# Altium footprint library Amirreza.PcbLib: 524 footprints (part 10 of 33)
Each footprint in its own frame and in the unit in brackets; x right, y up, seen from the top. Pads: shape width x height; smd on the part's side, far side on the other; paste and mask are expansions set on the pad; w line width, h text height; cw(c..) or ccw(c..) is an arc to the next point about the centre after c.
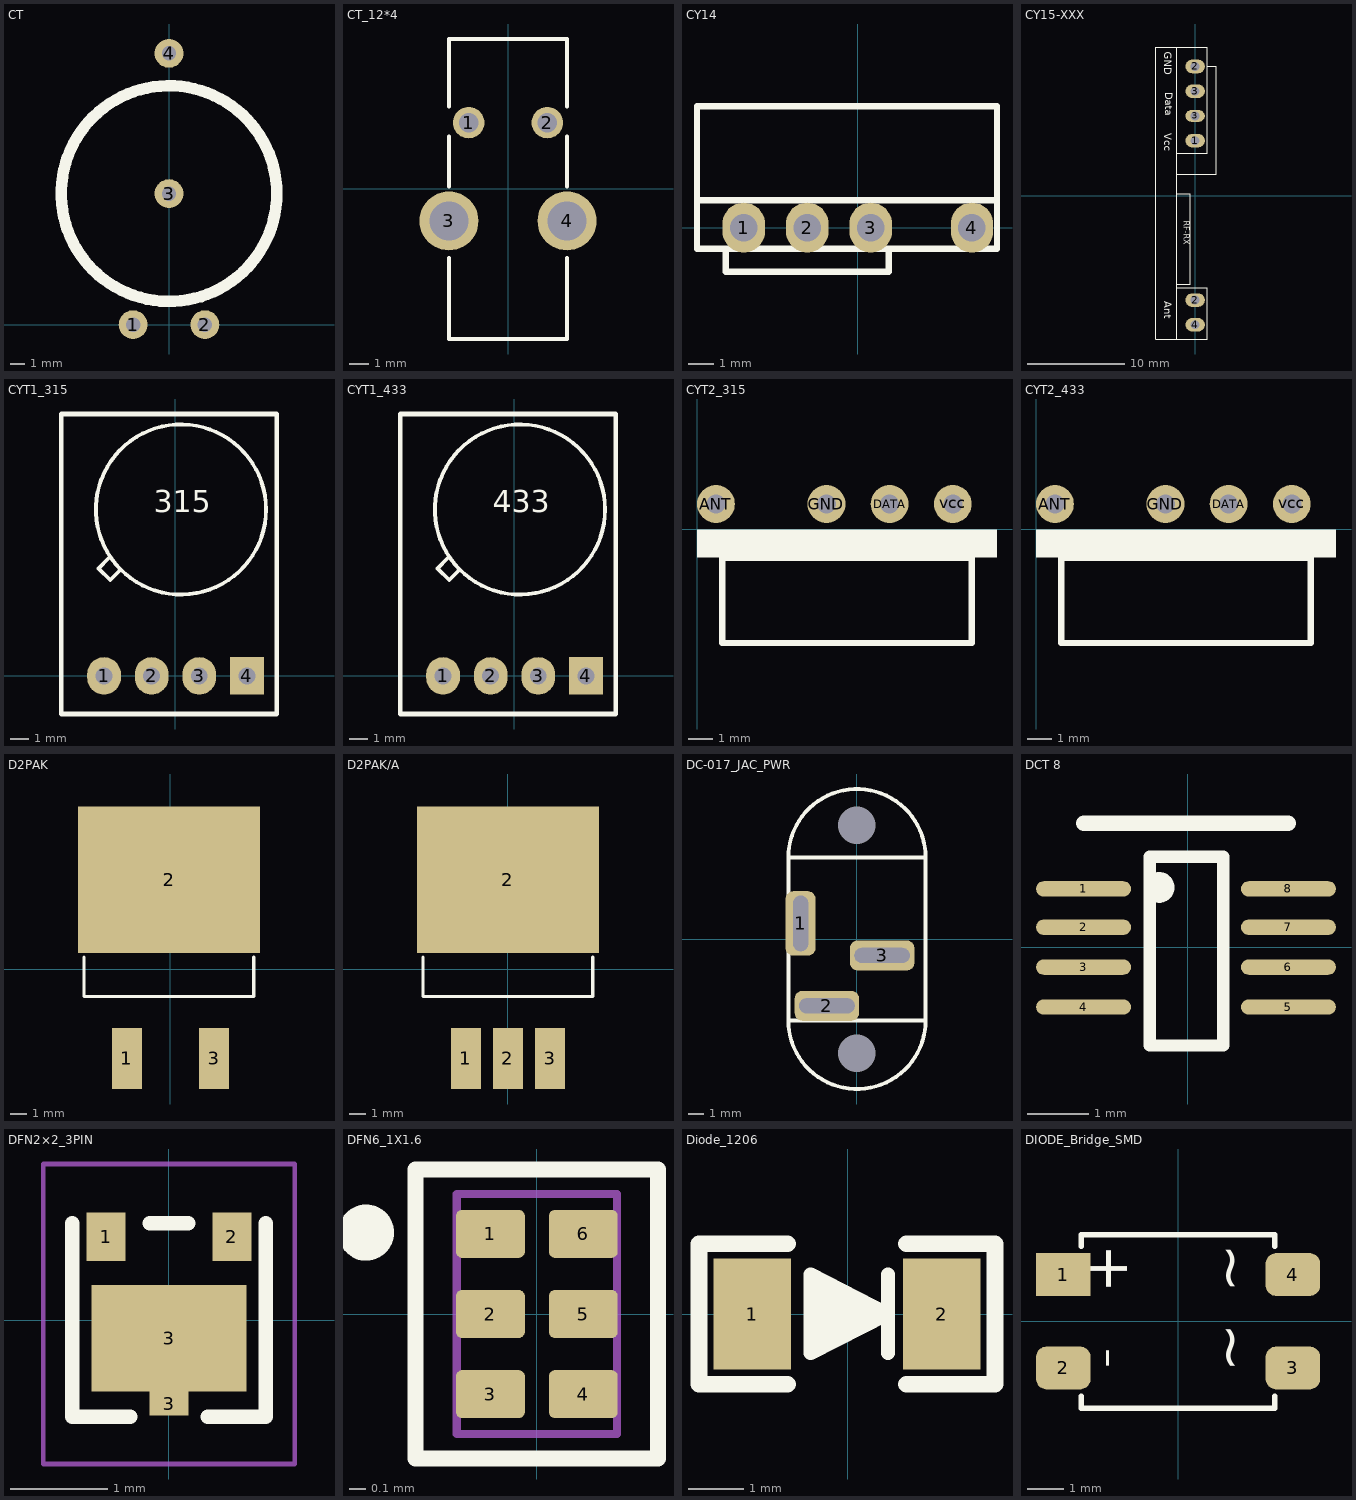
[diagram p9: the footprints below, top view; thin cyan lines are the x and y axes]

## CT [mm]
pads (4):
  round 2 hole 1: 1(-2.5,0) 2(2.5,0) 3(0,9.119) 4(0,18.872)
Top Overlay:
  circle w0.8: c0,9.119 r7.5
3D body "User Library-T16X9X5.step": height 7.21, standoff 0.15, extent -8.814,-2.283 8.899,18.285

## CT_12*4 [mm]
pads (4):
  round 1.6 / inner round 1.6 / far side round 2 hole 1: 1(-2,3.375) 2(2,3.375)
  round 3 / inner round 3 / far side oval 3x4 hole 2: 3(-3,-1.625) 4(3,-1.625)
Top Overlay:
  lines w0.203: -3,-3.511 -3,-7.625 3,-7.625 3,-3.511 ; -3,0.134 -3,2.676 ; -3,4.192 -3,7.625 3,7.625 3,4.192 ; 3,0.134 3,2.676

## CY14 [mm]
pads (4):
  oval 1.7x2 hole 1.1: 1(-4.565,0) 2(-2.025,0) 3(0.515,0) 4(4.565,0)
Top Overlay:
  lines w0.254: -6.435,1.1 5.534,1.1 ; -5.285,-0.894 -5.285,-1.771 1.236,-1.771 1.236,-0.901 ; 5.547,-0.85 -6.435,-0.85 -6.435,4.858 5.565,4.858 5.565,-0.85

## CY15-XXX [mm] "ASK/OOK Super-Heterodyne Receiver Module_rficy"
pads (6):
  oval 2x1.4 hole 0.9: 1(0,5.65) 2(0,-10.73) 2(0,13.27) 3(0,10.73) 4(0,-13.27)
  oval 2x1.2 hole 0.9: 3(0,8.19)
Top Overlay:
  lines w0.127: -4.064,-14.73 -4.064,15.27 -1.905,15.27 1.27,15.27 1.27,4.38 -1.905,4.38 ; -4.048,-14.73 1.27,-14.73 1.27,-9.46 -1.905,-9.46 ; -1.905,-14.721 -1.905,15.251 ; -1.905,-9.082 -0.5,-9.082 -0.5,0.189 -1.905,0.189 ; -1.905,2.221 2.19,2.221 2.19,13.27 1.27,13.27
  text "Ant" at -3.429,-10.86 h1.3
  text "Vcc" at -3.429,6.412 h1.3
  text "GND" at -3.429,14.794 h1.3
  text "Data" at -3.302,10.603 h1.3
  text "RF-RX" at -1.397,-2.605 h1
3D body "User Library-pc-jc02RA.STEP": height 12, standoff -5.68, extent -4.349,-15.344 2.571,14.656

## CYT1_315 [mm]
pads (4):
  oval 1.8x2 hole 0.9: 1(-3.81,0) 2(-1.27,0) 3(1.27,0)
  rect 1.8x2 hole 0.9: 4(3.81,0)
Top Overlay:
  circle w0.203: c0.292,8.877 r4.538
  lines w0.203: -3.569,6.273 -4.108,5.734 -3.48,5.106 -2.941,5.644
  lines w0.254: -6.095,-2.032 -6.095,13.968 5.405,13.968 5.405,-2.032 -6.095,-2.032
  text "315" at -1.156,8.319 h2

## CYT1_433 [mm]
pads (4):
  oval 1.8x2 hole 0.9: 1(-3.81,0) 2(-1.27,0) 3(1.27,0)
  rect 1.8x2 hole 0.9: 4(3.81,0)
Top Overlay:
  circle w0.203: c0.292,8.877 r4.538
  lines w0.203: -3.569,6.273 -4.108,5.734 -3.48,5.106 -2.941,5.644
  lines w0.254: -6.095,-2.032 5.405,-2.032 5.405,13.968 -6.095,13.968 -6.095,-2.032
  text "433" at -1.156,8.319 h2

## CYT2_315 [mil]
pads (4):
  round 60 hole 30: ANT(30,40) DATA(305,40) GND(205,40) vcc(405,40)
Top Overlay:
  rectangle: 0,-45 475,0
  lines w10: 40,-180 435,-180 435,-45 40,-45 40,-180

## CYT2_433 [mil]
pads (4):
  round 60 hole 30: ANT(30,40) DATA(305,40) GND(205,40) vcc(405,40)
Top Overlay:
  rectangle: 0,-45 475,0
  lines w10: 40,-180 435,-180 435,-45 40,-45 40,-180

## D2PAK [mm]
pads (3):
  rect 1.8x3.7 smd: 1(-2.64,-5.412) 3(2.64,-5.412)
  rect 11x8.9 smd: 2(-0.091,5.413)
Top Overlay:
  lines w0.2: -5.24,0.739 -5.24,-1.654 5.04,-1.654 5.04,0.739
3D body "User Library-DPAK.step": height 4.98, standoff -0.03, extent -5.156,-6.413 5.004,8.851

## D2PAK/A [mm]
pads (4):
  rect 1.8x3.7 smd: 1(-2.55,-5.412) 2(0,-5.412) 3(2.55,-5.412)
  rect 11x8.9 smd: 2(0,5.413)
Top Overlay:
  lines w0.2: -5.149,0.739 -5.149,-1.654 5.131,-1.654 5.131,0.739
3D body "User Library-TO263-3.STEP": height 4.78, standoff -0.02, extent -5.065,-6.819 4.935,8.851

## DC-017_JAC_PWR [mm] "DC-017 5.5mmx2.0mm DC Power Jack Socket 3 Pin Female"
pads (5):
  round 0 hole 2.5: 0(0,-7.6) 0(0,7.6)
  rrect50% 2x4.3 / inner rrect50% 0x0 / far side rrect50% 3x4.3 hole 1 slot 3.7 at 90 deg: 1(-3.755,1.035)
  rrect50% 4.3x2 / inner rrect50% 0x0 / far side rrect50% 4.3x3 hole 1 slot 3.7 at 0 deg: 2(-2.002,-4.451) 3(1.681,-1.099)
Top Overlay:
  lines w0.254: -4.575,-5.423 ccw(c0,-5.425) 4.575,-5.423 ; -4.575,-5.423 -4.575,5.423 ; -4.575,-5.423 4.575,-5.423 ; -4.575,5.423 cw(c0,5.425) 4.575,5.423 ; -4.575,5.423 4.575,5.423 ; 4.575,-5.423 4.575,5.423
3D body "dc-017-2_5a-2_0.stp": height 14, standoff -4, extent -5.05,-10.005 4.4,9.985

## DCT 8 [mm]
pads (8):
  oval 1.55x0.25 smd: 1(-1.7,0.953) 2(-1.7,0.328) 3(-1.7,-0.322) 4(-1.7,-0.972) 5(1.637,-0.972) 6(1.637,-0.322) 7(1.637,0.328) 8(1.637,0.953)
Top Overlay:
  circle w0.25: c-0.468,0.976 r0.125
  lines w0.2: -0.62,-1.597 -0.62,1.478 0.574,1.478 0.574,-1.597 -0.62,-1.597
  lines w0.254: -1.7,2.019 1.637,2.019
3D body "User Library-TXS0102DCTR-SSOP8.sldprt": height 1.05, standoff 0, extent -2.146,-1.575 2.146,1.575

## DFN2×2_3PIN [mm]
pads (4):
  rect 0.4x0.5 smd: 1(-0.65,0.863) 2(0.65,0.863)
  rect 0.4x0.25 smd: 3(0,-0.863)
  rect 1.6x1.1 smd: 3(0,-0.188)
Top Overlay:
  lines w0.152: -1,1 -1,-1 -0.4,-1 ; -0.2,1 0.2,1 ; 0.4,-1 1,-1 1,1
Mechanical 13:
  lines w0.05: -1.3,-1.488 -1.3,1.613 1.3,1.613 1.3,-1.488 -1.3,-1.488
3D body "User Library-User Library-SHTC3.step": height 0.75, standoff 0, extent -0.949,-0.934 1.051,1.066

## DFN6_1X1.6 [mm]
pads (6):
  rrect25% 0.43x0.3 smd: 1(-0.29,0.5) 2(-0.29,0) 3(-0.29,-0.5) 4(0.29,-0.5) 5(0.29,0) 6(0.29,0.5)
Top Overlay:
  circle w0.25: c-1.067,0.508 r0.05
  lines w0.1: -0.757,-0.902 0.757,-0.902 0.757,0.902 -0.757,0.902 -0.757,-0.902
Top Assembly:
  lines w0.05: -0.5,-0.75 -0.5,0.75 0.5,0.75 0.5,-0.75 -0.5,-0.75
3D body "MAX6384LT25D3+T.STEP": height 0.8, standoff 0, extent -0.5,-0.75 0.5,0.75

## Diode_1206 [mm]
pads (2):
  rect 1.4x2 smd: 1(-1.727,0) 2(1.702,0)
Top Overlay:
  rectangle: -0.671,-0.403 -0.079,0.457
  region: -0.736,-0.338 -0.561,-0.663 0.478,-0.104 0.303,0.222
  region: -0.573,0.754 -0.763,0.484 0.203,-0.194 0.392,0.075
  rectangle: -0.671,-0.102 0.477,0.121
  lines w0.254: 0.726,-0.706 0.726,0.715 ; -0.671,-0.706 -0.671,0.715 0.711,0 -0.671,-0.706
  lines w0.305: -1.092,-1.27 -2.692,-1.27 -2.692,1.27 -1.092,1.27 ; 1.067,-1.27 2.667,-1.27 2.667,1.27 1.067,1.27

## DIODE_Bridge_SMD [mm]
pads (4):
  rect 1.52x1.2 smd: 1(-3.195,1.3)
  rrect50% 1.52x1.2 smd: 2(-3.195,-1.3) 3(3.195,-1.3) 4(3.195,1.3)
Top Overlay:
  lines w0.152: -2.692,-2.083 -2.692,-2.415 0,-2.415 2.692,-2.415 2.692,-2.083 ; -2.692,2.083 -2.692,2.413 -2.21,2.413 0,2.413 2.21,2.413 2.692,2.413 2.692,2.083
  text "~" at 2.362,-1.422 h2.03
  text "~" at 2.362,0.787 h2.03
  text "-" at -1.168,-1.321 h2.03
  text "+" at -1.027,0.784 h2.03
3D body "User Library-moste3k.STEP": height 1.45, standoff -0.08, extent -3.503,-2.498 3.397,2.496